# Altium schematic symbol library jlcpcb_2025_04_capacitors_extended_0402.schlib: 3594 symbols (part 15 of 20) (continued)
## GRM155R61C475ME11D
designator C?  Capacitance: 4.7uF  (hidden comment: *)
Capacitor, Ceramic (MLCC), 4.7uF, 16V, X5R, SMD 0402; Manufacturer: Murata Electronics; Manufacturer Part Number: GRM155R61C475ME11D; Package Size: 0402; JLCPCB Basic Part: No; JLCPCB Part Number: C2986286; Supplier 1: LCSC; Category: Capacitors - MLCC; Supplier Part Number 1: C2986286; Voltage Rating: 16V; Temperature Coefficient: X5R; RoHS: Yes; ComponentLink1Description: Datasheet; ComponentLink1URL: https://wmsc.lcsc.com/wmsc/upload/file/pdf/v2/lcsc/2204251600_Murata-Electronics-GRM155R61C475ME11D_C2986286.pdf; ComponentLink2Description: JLCPCB Part URL; ComponentLink2URL: https://jlcpcb.com/partdetail/C2986286; ComponentLink3Description: LCSC Part URL; ComponentLink3URL: https://lcsc.com/product-detail/Multilayer-Ceramic-Capacitors-MLCC---SMD-SMT_Murata-Electronics-Murata-Electronics-GRM155R61C475ME11D_C2986286.html
footprint CAP-0402 (0402 (1005M) Capacitor)
pins: 1, 2

## GRM155R61C475ME15D
designator C?  Capacitance: 4.7uF  (hidden comment: *)
Capacitor, Ceramic (MLCC), 4.7uF, ±20%, ±20%, SMD 0402; Manufacturer: Murata Electronics; Manufacturer Part Number: GRM155R61C475ME15D; Package Size: 0402; JLCPCB Basic Part: No; JLCPCB Part Number: C913526; Supplier 1: LCSC; Category: Capacitors - MLCC; Supplier Part Number 1: C913526; Tolerance: ±20%; RoHS: Yes; ComponentLink1Description: Datasheet; ComponentLink2Description: JLCPCB Part URL; ComponentLink2URL: https://jlcpcb.com/partdetail/C913526; ComponentLink3Description: LCSC Part URL; ComponentLink3URL: https://lcsc.com/product-detail/Multilayer-Ceramic-Capacitors-MLCC---SMD-SMT_Murata-Electronics-Murata-Electronics-GRM155R61C475ME15D_C913526.html
footprint CAP-0402 (0402 (1005M) Capacitor)
pins: 1, 2

## GRM155R61E102KA01D
designator C?  Capacitance: 1nF  (hidden comment: *)
Capacitor, Ceramic (MLCC), 1nF, ±10%, 25V, X5R, ±10%, SMD 0402; Manufacturer: Murata Electronics; Manufacturer Part Number: GRM155R61E102KA01D; Package Size: 0402; JLCPCB Basic Part: No; JLCPCB Part Number: C188805; Supplier 1: LCSC; Category: Capacitors - MLCC; Supplier Part Number 1: C188805; Tolerance: ±10%; Voltage Rating: 25V; Temperature Coefficient: X5R; RoHS: Yes; ComponentLink1Description: Datasheet; ComponentLink1URL: https://wmsc.lcsc.com/wmsc/upload/file/pdf/v2/lcsc/1811081514_Murata-Electronics-GRM155R61E102KA01D_C188805.pdf; ComponentLink2Description: JLCPCB Part URL; ComponentLink2URL: https://jlcpcb.com/partdetail/C188805; ComponentLink3Description: LCSC Part URL; ComponentLink3URL: https://lcsc.com/product-detail/Multilayer-Ceramic-Capacitors-MLCC---SMD-SMT_Murata-Electronics-Murata-Electronics-GRM155R61E102KA01D_C188805.html
footprint CAP-0402 (0402 (1005M) Capacitor)
pins: 1, 2

## GRM155R61E104KA87D
designator C?  Capacitance: 100nF  (hidden comment: *)
Capacitor, Ceramic (MLCC), 100nF, ±10%, 25V, X5R, ±10%, SMD 0402; Manufacturer: Murata Electronics; Manufacturer Part Number: GRM155R61E104KA87D; Package Size: 0402; JLCPCB Basic Part: No; JLCPCB Part Number: C77008; Supplier 1: LCSC; Category: Capacitors - MLCC; Supplier Part Number 1: C77008; Tolerance: ±10%; Voltage Rating: 25V; Temperature Coefficient: X5R; RoHS: Yes; ComponentLink1Description: Datasheet; ComponentLink1URL: https://wmsc.lcsc.com/wmsc/upload/file/pdf/v2/lcsc/1806151821_Murata-Electronics-GRM155R61E104KA87D_C77008.pdf; ComponentLink2Description: JLCPCB Part URL; ComponentLink2URL: https://jlcpcb.com/partdetail/C77008; ComponentLink3Description: LCSC Part URL; ComponentLink3URL: https://lcsc.com/product-detail/Multilayer-Ceramic-Capacitors-MLCC---SMD-SMT_Murata-Electronics-Murata-Electronics-GRM155R61E104KA87D_C77008.html
footprint CAP-0402 (0402 (1005M) Capacitor)
pins: 1, 2

## GRM155R61E105KA12D
designator C?  Capacitance: 1uF  (hidden comment: *)
Capacitor, Ceramic (MLCC), 1uF, ±10%, 25V, X5R, ±10%, SMD 0402; Manufacturer: Murata Electronics; Manufacturer Part Number: GRM155R61E105KA12D; Package Size: 0402; JLCPCB Basic Part: No; JLCPCB Part Number: C77009; Supplier 1: LCSC; Category: Capacitors - MLCC; Supplier Part Number 1: C77009; Tolerance: ±10%; Voltage Rating: 25V; Temperature Coefficient: X5R; RoHS: Yes; ComponentLink1Description: Datasheet; ComponentLink1URL: https://wmsc.lcsc.com/wmsc/upload/file/pdf/v2/lcsc/1811081616_Murata-Electronics-GRM155R61E105KA12D_C77009.pdf; ComponentLink2Description: JLCPCB Part URL; ComponentLink2URL: https://jlcpcb.com/partdetail/C77009; ComponentLink3Description: LCSC Part URL; ComponentLink3URL: https://lcsc.com/product-detail/Multilayer-Ceramic-Capacitors-MLCC---SMD-SMT_Murata-Electronics-Murata-Electronics-GRM155R61E105KA12D_C77009.html
footprint CAP-0402 (0402 (1005M) Capacitor)
pins: 1, 2

## GRM155R61E105KE11D
designator C?  Capacitance: 1uF  (hidden comment: *)
Capacitor, Ceramic (MLCC), 1uF, ±10%, 25V, X5R, ±10%, SMD 0402; Manufacturer: Murata Electronics; Manufacturer Part Number: GRM155R61E105KE11D; Package Size: 0402; JLCPCB Basic Part: No; JLCPCB Part Number: C426636; Supplier 1: LCSC; Category: Capacitors - MLCC; Supplier Part Number 1: C426636; Tolerance: ±10%; Voltage Rating: 25V; Temperature Coefficient: X5R; RoHS: Yes; ComponentLink1Description: Datasheet; ComponentLink1URL: https://wmsc.lcsc.com/wmsc/upload/file/pdf/v2/lcsc/2304140030_Murata-Electronics-GRM155R61E105KE11D_C426636.pdf; ComponentLink2Description: JLCPCB Part URL; ComponentLink2URL: https://jlcpcb.com/partdetail/C426636; ComponentLink3Description: LCSC Part URL; ComponentLink3URL: https://lcsc.com/product-detail/Multilayer-Ceramic-Capacitors-MLCC---SMD-SMT_Murata-Electronics-Murata-Electronics-GRM155R61E105KE11D_C426636.html
footprint CAP-0402 (0402 (1005M) Capacitor)
pins: 1, 2

## GRM155R61E105MA12D
designator C?  Capacitance: 1uF  (hidden comment: *)
Capacitor, Ceramic (MLCC), 1uF, ±20%, 25V, X5R, ±20%, SMD 0402; Manufacturer: Murata Electronics; Manufacturer Part Number: GRM155R61E105MA12D; Package Size: 0402; JLCPCB Basic Part: No; JLCPCB Part Number: C181014; Supplier 1: LCSC; Category: Capacitors - MLCC; Supplier Part Number 1: C181014; Tolerance: ±20%; Voltage Rating: 25V; Temperature Coefficient: X5R; RoHS: Yes; ComponentLink1Description: Datasheet; ComponentLink1URL: https://wmsc.lcsc.com/wmsc/upload/file/pdf/v2/lcsc/2308111636_Murata-Electronics-GRM155R61E105MA12D_C181014.pdf; ComponentLink2Description: JLCPCB Part URL; ComponentLink2URL: https://jlcpcb.com/partdetail/C181014; ComponentLink3Description: LCSC Part URL; ComponentLink3URL: https://lcsc.com/product-detail/Multilayer-Ceramic-Capacitors-MLCC---SMD-SMT_Murata-Electronics-Murata-Electronics-GRM155R61E105MA12D_C181014.html
footprint CAP-0402 (0402 (1005M) Capacitor)
pins: 1, 2

## GRM155R61E222KA01D
designator C?  Capacitance: 2.2nF  (hidden comment: *)
Capacitor, Ceramic (MLCC), 2.2nF, ±10%, 25V, X5R, ±10%, SMD 0402; Manufacturer: Murata Electronics; Manufacturer Part Number: GRM155R61E222KA01D; Package Size: 0402; JLCPCB Basic Part: No; JLCPCB Part Number: C528973; Supplier 1: LCSC; Category: Capacitors - MLCC; Supplier Part Number 1: C528973; Tolerance: ±10%; Voltage Rating: 25V; Temperature Coefficient: X5R; RoHS: Yes; ComponentLink1Description: Datasheet; ComponentLink1URL: https://wmsc.lcsc.com/wmsc/upload/file/pdf/v2/lcsc/2005141808_Murata-Electronics-GRM155R61E222KA01D_C528973.pdf; ComponentLink2Description: JLCPCB Part URL; ComponentLink2URL: https://jlcpcb.com/partdetail/C528973; ComponentLink3Description: LCSC Part URL; ComponentLink3URL: https://lcsc.com/product-detail/Multilayer-Ceramic-Capacitors-MLCC---SMD-SMT_Murata-Electronics-Murata-Electronics-GRM155R61E222KA01D_C528973.html
footprint CAP-0402 (0402 (1005M) Capacitor)
pins: 1, 2

## GRM155R61E224KE01D
designator C?  Capacitance: 220nF  (hidden comment: *)
Capacitor, Ceramic (MLCC), 220nF, ±10%, 25V, X5R, ±10%, SMD 0402; Manufacturer: Murata Electronics; Manufacturer Part Number: GRM155R61E224KE01D; Package Size: 0402; JLCPCB Basic Part: No; JLCPCB Part Number: C162177; Supplier 1: LCSC; Category: Capacitors - MLCC; Supplier Part Number 1: C162177; Tolerance: ±10%; Voltage Rating: 25V; Temperature Coefficient: X5R; RoHS: Yes; ComponentLink1Description: Datasheet; ComponentLink1URL: https://wmsc.lcsc.com/wmsc/upload/file/pdf/v2/lcsc/1912111437_Murata-Electronics-GRM155R61E224KE01D_C162177.pdf; ComponentLink2Description: JLCPCB Part URL; ComponentLink2URL: https://jlcpcb.com/partdetail/C162177; ComponentLink3Description: LCSC Part URL; ComponentLink3URL: https://lcsc.com/product-detail/Multilayer-Ceramic-Capacitors-MLCC---SMD-SMT_Murata-Electronics-Murata-Electronics-GRM155R61E224KE01D_C162177.html
footprint CAP-0402 (0402 (1005M) Capacitor)
pins: 1, 2

## GRM155R61E225KE11D
designator C?  Capacitance: 2.2uF  (hidden comment: *)
Capacitor, Ceramic (MLCC), 2.2uF, ±10%, 25V, X5R, ±10%, SMD 0402; Manufacturer: Murata Electronics; Manufacturer Part Number: GRM155R61E225KE11D; Package Size: 0402; JLCPCB Basic Part: No; JLCPCB Part Number: C385032; Supplier 1: LCSC; Category: Capacitors - MLCC; Supplier Part Number 1: C385032; Tolerance: ±10%; Voltage Rating: 25V; Temperature Coefficient: X5R; RoHS: Yes; ComponentLink1Description: Datasheet; ComponentLink1URL: https://wmsc.lcsc.com/wmsc/upload/file/pdf/v2/lcsc/1912111437_Murata-Electronics-GRM155R61E225KE11D_C385032.pdf; ComponentLink2Description: JLCPCB Part URL; ComponentLink2URL: https://jlcpcb.com/partdetail/C385032; ComponentLink3Description: LCSC Part URL; ComponentLink3URL: https://lcsc.com/product-detail/Multilayer-Ceramic-Capacitors-MLCC---SMD-SMT_Murata-Electronics-Murata-Electronics-GRM155R61E225KE11D_C385032.html
footprint CAP-0402 (0402 (1005M) Capacitor)
pins: 1, 2

## GRM155R61E225ME15D
designator C?  Capacitance: 2.2uF  (hidden comment: *)
Capacitor, Ceramic (MLCC), 2.2uF, ±20%, 25V, X5R, ±20%, SMD 0402; Manufacturer: Murata Electronics; Manufacturer Part Number: GRM155R61E225ME15D; Package Size: 0402; JLCPCB Basic Part: No; JLCPCB Part Number: C72203; Supplier 1: LCSC; Category: Capacitors - MLCC; Supplier Part Number 1: C72203; Tolerance: ±20%; Voltage Rating: 25V; Temperature Coefficient: X5R; RoHS: Yes; ComponentLink1Description: Datasheet; ComponentLink1URL: https://wmsc.lcsc.com/wmsc/upload/file/pdf/v2/lcsc/2001171841_Murata-Electronics-GRM155R61E225ME15D_C72203.pdf; ComponentLink2Description: JLCPCB Part URL; ComponentLink2URL: https://jlcpcb.com/partdetail/C72203; ComponentLink3Description: LCSC Part URL; ComponentLink3URL: https://lcsc.com/product-detail/Multilayer-Ceramic-Capacitors-MLCC---SMD-SMT_Murata-Electronics-Murata-Electronics-GRM155R61E225ME15D_C72203.html
footprint CAP-0402 (0402 (1005M) Capacitor)
pins: 1, 2

## GRM155R61E474KA12D
designator C?  Capacitance: 470nF  (hidden comment: *)
Capacitor, Ceramic (MLCC), 470nF, ±10%, ±10%, SMD 0402; Manufacturer: Murata Electronics; Manufacturer Part Number: GRM155R61E474KA12D; Package Size: 0402; JLCPCB Basic Part: No; JLCPCB Part Number: C426055; Supplier 1: LCSC; Category: Capacitors - MLCC; Supplier Part Number 1: C426055; Tolerance: ±10%; RoHS: Yes; ComponentLink1Description: Datasheet; ComponentLink1URL: https://wmsc.lcsc.com/wmsc/upload/file/pdf/v2/lcsc/2204251630_Murata-Electronics-GRM155R61E474KA12D_C426055.pdf; ComponentLink2Description: JLCPCB Part URL; ComponentLink2URL: https://jlcpcb.com/partdetail/C426055; ComponentLink3Description: LCSC Part URL; ComponentLink3URL: https://lcsc.com/product-detail/Multilayer-Ceramic-Capacitors-MLCC---SMD-SMT_Murata-Electronics-Murata-Electronics-GRM155R61E474KA12D_C426055.html
footprint CAP-0402 (0402 (1005M) Capacitor)
pins: 1, 2

## GRM155R61E474KE01D
designator C?  Capacitance: 470nF  (hidden comment: *)
Capacitor, Ceramic (MLCC), 470nF, ±10%, 25V, X5R, ±10%, SMD 0402; Manufacturer: Murata Electronics; Manufacturer Part Number: GRM155R61E474KE01D; Package Size: 0402; JLCPCB Basic Part: No; JLCPCB Part Number: C437526; Supplier 1: LCSC; Category: Capacitors - MLCC; Supplier Part Number 1: C437526; Tolerance: ±10%; Voltage Rating: 25V; Temperature Coefficient: X5R; RoHS: Yes; ComponentLink1Description: Datasheet; ComponentLink1URL: https://wmsc.lcsc.com/wmsc/upload/file/pdf/v2/lcsc/2202140030_Murata-Electronics-GRM155R61E474KE01D_C437526.pdf; ComponentLink2Description: JLCPCB Part URL; ComponentLink2URL: https://jlcpcb.com/partdetail/C437526; ComponentLink3Description: LCSC Part URL; ComponentLink3URL: https://lcsc.com/product-detail/Multilayer-Ceramic-Capacitors-MLCC---SMD-SMT_Murata-Electronics-Murata-Electronics-GRM155R61E474KE01D_C437526.html
footprint CAP-0402 (0402 (1005M) Capacitor)
pins: 1, 2

## GRM155R61E475ME15D
designator C?  Capacitance: 4.7uF  (hidden comment: *)
Capacitor, Ceramic (MLCC), 4.7uF, 25V, X5R, SMD 0402; Manufacturer: Murata Electronics; Manufacturer Part Number: GRM155R61E475ME15D; Package Size: 0402; JLCPCB Basic Part: No; JLCPCB Part Number: C2858031; Supplier 1: LCSC; Category: Capacitors - MLCC; Supplier Part Number 1: C2858031; Voltage Rating: 25V; Temperature Coefficient: X5R; RoHS: Yes; ComponentLink1Description: Datasheet; ComponentLink1URL: https://wmsc.lcsc.com/wmsc/upload/file/pdf/v2/lcsc/2108150230_Murata-Electronics-GRM155R61E475ME15D_C2858031.pdf; ComponentLink2Description: JLCPCB Part URL; ComponentLink2URL: https://jlcpcb.com/partdetail/C2858031; ComponentLink3Description: LCSC Part URL; ComponentLink3URL: https://lcsc.com/product-detail/Multilayer-Ceramic-Capacitors-MLCC---SMD-SMT_Murata-Electronics-Murata-Electronics-GRM155R61E475ME15D_C2858031.html
footprint CAP-0402 (0402 (1005M) Capacitor)
pins: 1, 2

## GRM155R61H102KA01D
designator C?  Capacitance: 1nF  (hidden comment: *)
Capacitor, Ceramic (MLCC), 1nF, ±10%, null, X5R, ±10%, SMD 0402; Manufacturer: Murata Electronics; Manufacturer Part Number: GRM155R61H102KA01D; Package Size: 0402; JLCPCB Basic Part: No; JLCPCB Part Number: C701318; Supplier 1: LCSC; Category: Capacitors - MLCC; Supplier Part Number 1: C701318; Tolerance: ±10%; Voltage Rating: null; Temperature Coefficient: X5R; RoHS: Yes; ComponentLink1Description: Datasheet; ComponentLink1URL: https://wmsc.lcsc.com/wmsc/upload/file/pdf/v2/lcsc/2304140030_Murata-Electronics-GRM155R61H102KA01D_C701318.pdf; ComponentLink2Description: JLCPCB Part URL; ComponentLink2URL: https://jlcpcb.com/partdetail/C701318; ComponentLink3Description: LCSC Part URL; ComponentLink3URL: https://lcsc.com/product-detail/Multilayer-Ceramic-Capacitors-MLCC---SMD-SMT_Murata-Electronics-Murata-Electronics-GRM155R61H102KA01D_C701318.html
footprint CAP-0402 (0402 (1005M) Capacitor)
pins: 1, 2

## GRM155R61H104JE14D
designator C?  Capacitance: 100nF  (hidden comment: *)
Capacitor, Ceramic (MLCC), 100nF, ±5%, ±5%, SMD 0402; Manufacturer: Murata Electronics; Manufacturer Part Number: GRM155R61H104JE14D; Package Size: 0402; JLCPCB Basic Part: No; JLCPCB Part Number: C426067; Supplier 1: LCSC; Category: Capacitors - MLCC; Supplier Part Number 1: C426067; Tolerance: ±5%; RoHS: Yes; ComponentLink1Description: Datasheet; ComponentLink1URL: https://wmsc.lcsc.com/wmsc/upload/file/pdf/v2/lcsc/2304140030_Murata-Electronics-GRM155R61H104JE14D_C426067.pdf; ComponentLink2Description: JLCPCB Part URL; ComponentLink2URL: https://jlcpcb.com/partdetail/C426067; ComponentLink3Description: LCSC Part URL; ComponentLink3URL: https://lcsc.com/product-detail/Multilayer-Ceramic-Capacitors-MLCC---SMD-SMT_Murata-Electronics-Murata-Electronics-GRM155R61H104JE14D_C426067.html
footprint CAP-0402 (0402 (1005M) Capacitor)
pins: 1, 2

## GRM155R61H104KE14D
designator C?  Capacitance: 100nF  (hidden comment: *)
Capacitor, Ceramic (MLCC), 100nF, ±10%, 50V, X5R, ±10%, SMD 0402; Manufacturer: Murata Electronics; Manufacturer Part Number: GRM155R61H104KE14D; Package Size: 0402; JLCPCB Basic Part: No; JLCPCB Part Number: C85960; Supplier 1: LCSC; Category: Capacitors - MLCC; Supplier Part Number 1: C85960; Tolerance: ±10%; Voltage Rating: 50V; Temperature Coefficient: X5R; RoHS: Yes; ComponentLink1Description: Datasheet; ComponentLink1URL: https://wmsc.lcsc.com/wmsc/upload/file/pdf/v2/lcsc/2304140030_Murata-Electronics-GRM155R61H104KE14D_C85960.pdf; ComponentLink2Description: JLCPCB Part URL; ComponentLink2URL: https://jlcpcb.com/partdetail/C85960; ComponentLink3Description: LCSC Part URL; ComponentLink3URL: https://lcsc.com/product-detail/Multilayer-Ceramic-Capacitors-MLCC---SMD-SMT_Murata-Electronics-Murata-Electronics-GRM155R61H104KE14D_C85960.html
footprint CAP-0402 (0402 (1005M) Capacitor)
pins: 1, 2

## GRM155R61H105KE05D
designator C?  Capacitance: 1uF  (hidden comment: *)
Capacitor, Ceramic (MLCC), 1uF, ±10%, 50V, X5R, ±10%, SMD 0402; Manufacturer: Murata Electronics; Manufacturer Part Number: GRM155R61H105KE05D; Package Size: 0402; JLCPCB Basic Part: No; JLCPCB Part Number: C1518208; Supplier 1: LCSC; Category: Capacitors - MLCC; Supplier Part Number 1: C1518208; Tolerance: ±10%; Voltage Rating: 50V; Temperature Coefficient: X5R; RoHS: Yes; ComponentLink1Description: Datasheet; ComponentLink1URL: https://wmsc.lcsc.com/wmsc/upload/file/pdf/v2/lcsc/2201180430_Murata-Electronics-GRM155R61H105KE05D_C1518208.pdf; ComponentLink2Description: JLCPCB Part URL; ComponentLink2URL: https://jlcpcb.com/partdetail/C1518208; ComponentLink3Description: LCSC Part URL; ComponentLink3URL: https://lcsc.com/product-detail/Multilayer-Ceramic-Capacitors-MLCC---SMD-SMT_Murata-Electronics-Murata-Electronics-GRM155R61H105KE05D_C1518208.html
footprint CAP-0402 (0402 (1005M) Capacitor)
pins: 1, 2

## GRM155R61H105ME05D
designator C?  Capacitance: 1uF  (hidden comment: *)
Capacitor, Ceramic (MLCC), 1uF, ±20%, 50V, X5R, ±20%, SMD 0402; Manufacturer: Murata Electronics; Manufacturer Part Number: GRM155R61H105ME05D; Package Size: 0402; JLCPCB Basic Part: No; JLCPCB Part Number: C5119299; Supplier 1: LCSC; Category: Capacitors - MLCC; Supplier Part Number 1: C5119299; Tolerance: ±20%; Voltage Rating: 50V; Temperature Coefficient: X5R; RoHS: Yes; ComponentLink1Description: Datasheet; ComponentLink1URL: https://wmsc.lcsc.com/wmsc/upload/file/pdf/v2/lcsc/2207251801_Murata-Electronics-GRM155R61H105ME05D_C5119299.pdf; ComponentLink2Description: JLCPCB Part URL; ComponentLink2URL: https://jlcpcb.com/partdetail/C5119299; ComponentLink3Description: LCSC Part URL; ComponentLink3URL: https://lcsc.com/product-detail/Multilayer-Ceramic-Capacitors-MLCC---SMD-SMT_Murata-Electronics-Murata-Electronics-GRM155R61H105ME05D_C5119299.html
footprint CAP-0402 (0402 (1005M) Capacitor)
pins: 1, 2

## GRM155R61H472KA01D
designator C?  Capacitance: 4.7nF  (hidden comment: *)
Capacitor, Ceramic (MLCC), 4.7nF, ±10%, null, X5R, ±10%, SMD 0402; Manufacturer: Murata Electronics; Manufacturer Part Number: GRM155R61H472KA01D; Package Size: 0402; JLCPCB Basic Part: No; JLCPCB Part Number: C237393; Supplier 1: LCSC; Category: Capacitors - MLCC; Supplier Part Number 1: C237393; Tolerance: ±10%; Voltage Rating: null; Temperature Coefficient: X5R; RoHS: Yes; ComponentLink1Description: Datasheet; ComponentLink1URL: https://wmsc.lcsc.com/wmsc/upload/file/pdf/v2/lcsc/2011191435_Murata-Electronics-GRM155R61H472KA01D_C237393.pdf; ComponentLink2Description: JLCPCB Part URL; ComponentLink2URL: https://jlcpcb.com/partdetail/C237393; ComponentLink3Description: LCSC Part URL; ComponentLink3URL: https://lcsc.com/product-detail/Multilayer-Ceramic-Capacitors-MLCC---SMD-SMT_Murata-Electronics-Murata-Electronics-GRM155R61H472KA01D_C237393.html
footprint CAP-0402 (0402 (1005M) Capacitor)
pins: 1, 2

## GRM155R61H473KE19D
designator C?  Capacitance: 47nF  (hidden comment: *)
Capacitor, Ceramic (MLCC), 47nF, ±10%, null, X5R, ±10%, SMD 0402; Manufacturer: Murata Electronics; Manufacturer Part Number: GRM155R61H473KE19D; Package Size: 0402; JLCPCB Basic Part: No; JLCPCB Part Number: C913545; Supplier 1: LCSC; Category: Capacitors - MLCC; Supplier Part Number 1: C913545; Tolerance: ±10%; Voltage Rating: null; Temperature Coefficient: X5R; RoHS: Yes; ComponentLink1Description: Datasheet; ComponentLink1URL: https://wmsc.lcsc.com/wmsc/upload/file/pdf/v2/lcsc/2201131300_Murata-Electronics-GRM155R61H473KE19D_C913545.pdf; ComponentLink2Description: JLCPCB Part URL; ComponentLink2URL: https://jlcpcb.com/partdetail/C913545; ComponentLink3Description: LCSC Part URL; ComponentLink3URL: https://lcsc.com/product-detail/Multilayer-Ceramic-Capacitors-MLCC---SMD-SMT_Murata-Electronics-Murata-Electronics-GRM155R61H473KE19D_C913545.html
footprint CAP-0402 (0402 (1005M) Capacitor)
pins: 1, 2

## GRM155R61H474KE11D
designator C?  Capacitance: 470nF  (hidden comment: *)
Capacitor, Ceramic (MLCC), 470nF, ±10%, 50V, X5R, ±10%, SMD 0402; Manufacturer: Murata Electronics; Manufacturer Part Number: GRM155R61H474KE11D; Package Size: 0402; JLCPCB Basic Part: No; JLCPCB Part Number: C437527; Supplier 1: LCSC; Category: Capacitors - MLCC; Supplier Part Number 1: C437527; Tolerance: ±10%; Voltage Rating: 50V; Temperature Coefficient: X5R; RoHS: Yes; ComponentLink1Description: Datasheet; ComponentLink1URL: https://wmsc.lcsc.com/wmsc/upload/file/pdf/v2/lcsc/2304140030_Murata-Electronics-GRM155R61H474KE11D_C437527.pdf; ComponentLink2Description: JLCPCB Part URL; ComponentLink2URL: https://jlcpcb.com/partdetail/C437527; ComponentLink3Description: LCSC Part URL; ComponentLink3URL: https://lcsc.com/product-detail/Multilayer-Ceramic-Capacitors-MLCC---SMD-SMT_Murata-Electronics-Murata-Electronics-GRM155R61H474KE11D_C437527.html
footprint CAP-0402 (0402 (1005M) Capacitor)
pins: 1, 2

## GRM155R62A104KE14D
designator C?  Capacitance: 100nF  (hidden comment: *)
Capacitor, Ceramic (MLCC), 100nF, ±10%, 100V, X5R, ±10%, SMD 0402; Manufacturer: Murata Electronics; Manufacturer Part Number: GRM155R62A104KE14D; Package Size: 0402; JLCPCB Basic Part: No; JLCPCB Part Number: C162178; Supplier 1: LCSC; Category: Capacitors - MLCC; Supplier Part Number 1: C162178; Tolerance: ±10%; Voltage Rating: 100V; Temperature Coefficient: X5R; RoHS: Yes; ComponentLink1Description: Datasheet; ComponentLink1URL: https://wmsc.lcsc.com/wmsc/upload/file/pdf/v2/lcsc/2010101433_Murata-Electronics-GRM155R62A104KE14D_C162178.pdf; ComponentLink2Description: JLCPCB Part URL; ComponentLink2URL: https://jlcpcb.com/partdetail/C162178; ComponentLink3Description: LCSC Part URL; ComponentLink3URL: https://lcsc.com/product-detail/Multilayer-Ceramic-Capacitors-MLCC---SMD-SMT_Murata-Electronics-Murata-Electronics-GRM155R62A104KE14D_C162178.html
footprint CAP-0402 (0402 (1005M) Capacitor)
pins: 1, 2

## GRM155R62A104ME14D
designator C?  Capacitance: 100nF  (hidden comment: *)
Capacitor, Ceramic (MLCC), 100nF, ±20%, 100V, X5R, ±20%, SMD 0402; Manufacturer: Murata Electronics; Manufacturer Part Number: GRM155R62A104ME14D; Package Size: 0402; JLCPCB Basic Part: No; JLCPCB Part Number: C162179; Supplier 1: LCSC; Category: Capacitors - MLCC; Supplier Part Number 1: C162179; Tolerance: ±20%; Voltage Rating: 100V; Temperature Coefficient: X5R; RoHS: Yes; ComponentLink1Description: Datasheet; ComponentLink1URL: https://wmsc.lcsc.com/wmsc/upload/file/pdf/v2/lcsc/2304140030_Murata-Electronics-GRM155R62A104ME14D_C162179.pdf; ComponentLink2Description: JLCPCB Part URL; ComponentLink2URL: https://jlcpcb.com/partdetail/C162179; ComponentLink3Description: LCSC Part URL; ComponentLink3URL: https://lcsc.com/product-detail/Multilayer-Ceramic-Capacitors-MLCC---SMD-SMT_Murata-Electronics-Murata-Electronics-GRM155R62A104ME14D_C162179.html
footprint CAP-0402 (0402 (1005M) Capacitor)
pins: 1, 2

## GRM155R70J105KA12D
designator C?  Capacitance: 1uF  (hidden comment: *)
Capacitor, Ceramic (MLCC), 1uF, ±10%, 6.3V, X7R, ±10%, SMD 0402; Manufacturer: Murata Electronics; Manufacturer Part Number: GRM155R70J105KA12D; Package Size: 0402; JLCPCB Basic Part: No; JLCPCB Part Number: C88945; Supplier 1: LCSC; Category: Capacitors - MLCC; Supplier Part Number 1: C88945; Tolerance: ±10%; Voltage Rating: 6.3V; Temperature Coefficient: X7R; RoHS: Yes; ComponentLink1Description: Datasheet; ComponentLink1URL: https://wmsc.lcsc.com/wmsc/upload/file/pdf/v2/lcsc/2304140030_Murata-Electronics-GRM155R70J105KA12D_C88945.pdf; ComponentLink2Description: JLCPCB Part URL; ComponentLink2URL: https://jlcpcb.com/partdetail/C88945; ComponentLink3Description: LCSC Part URL; ComponentLink3URL: https://lcsc.com/product-detail/Multilayer-Ceramic-Capacitors-MLCC---SMD-SMT_Murata-Electronics-Murata-Electronics-GRM155R70J105KA12D_C88945.html
footprint CAP-0402 (0402 (1005M) Capacitor)
pins: 1, 2

## GRM155R70J105MA12D
designator C?  Capacitance: 1uF  (hidden comment: *)
Capacitor, Ceramic (MLCC), 1uF, ±20%, 6.3V, X7R, ±20%, SMD 0402; Manufacturer: Murata Electronics; Manufacturer Part Number: GRM155R70J105MA12D; Package Size: 0402; JLCPCB Basic Part: No; JLCPCB Part Number: C913490; Supplier 1: LCSC; Category: Capacitors - MLCC; Supplier Part Number 1: C913490; Tolerance: ±20%; Voltage Rating: 6.3V; Temperature Coefficient: X7R; RoHS: Yes; ComponentLink1Description: Datasheet; ComponentLink1URL: https://wmsc.lcsc.com/wmsc/upload/file/pdf/v2/lcsc/2201131300_Murata-Electronics-GRM155R70J105MA12D_C913490.pdf; ComponentLink2Description: JLCPCB Part URL; ComponentLink2URL: https://jlcpcb.com/partdetail/C913490; ComponentLink3Description: LCSC Part URL; ComponentLink3URL: https://lcsc.com/product-detail/Multilayer-Ceramic-Capacitors-MLCC---SMD-SMT_Murata-Electronics-Murata-Electronics-GRM155R70J105MA12D_C913490.html
footprint CAP-0402 (0402 (1005M) Capacitor)
pins: 1, 2

## GRM155R71A104KA01D
designator C?  Capacitance: 100nF  (hidden comment: *)
Capacitor, Ceramic (MLCC), 100nF, ±10%, 10V, X7R, ±10%, SMD 0402; Manufacturer: Murata Electronics; Manufacturer Part Number: GRM155R71A104KA01D; Package Size: 0402; JLCPCB Basic Part: No; JLCPCB Part Number: C71687; Supplier 1: LCSC; Category: Capacitors - MLCC; Supplier Part Number 1: C71687; Tolerance: ±10%; Voltage Rating: 10V; Temperature Coefficient: X7R; RoHS: Yes; ComponentLink1Description: Datasheet; ComponentLink1URL: https://wmsc.lcsc.com/wmsc/upload/file/pdf/v2/lcsc/1811081610_Murata-Electronics-GRM155R71A104KA01D_C71687.pdf; ComponentLink2Description: JLCPCB Part URL; ComponentLink2URL: https://jlcpcb.com/partdetail/C71687; ComponentLink3Description: LCSC Part URL; ComponentLink3URL: https://lcsc.com/product-detail/Multilayer-Ceramic-Capacitors-MLCC---SMD-SMT_Murata-Electronics-Murata-Electronics-GRM155R71A104KA01D_C71687.html
footprint CAP-0402 (0402 (1005M) Capacitor)
pins: 1, 2

## GRM155R71A224KE01D
designator C?  Capacitance: 220nF  (hidden comment: *)
Capacitor, Ceramic (MLCC), 220nF, ±10%, 10V, X7R, ±10%, SMD 0402; Manufacturer: Murata Electronics; Manufacturer Part Number: GRM155R71A224KE01D; Package Size: 0402; JLCPCB Basic Part: No; JLCPCB Part Number: C180472; Supplier 1: LCSC; Category: Capacitors - MLCC; Supplier Part Number 1: C180472; Tolerance: ±10%; Voltage Rating: 10V; Temperature Coefficient: X7R; RoHS: Yes; ComponentLink1Description: Datasheet; ComponentLink1URL: https://wmsc.lcsc.com/wmsc/upload/file/pdf/v2/lcsc/1811081530_Murata-Electronics-GRM155R71A224KE01D_C180472.pdf; ComponentLink2Description: JLCPCB Part URL; ComponentLink2URL: https://jlcpcb.com/partdetail/C180472; ComponentLink3Description: LCSC Part URL; ComponentLink3URL: https://lcsc.com/product-detail/Multilayer-Ceramic-Capacitors-MLCC---SMD-SMT_Murata-Electronics-Murata-Electronics-GRM155R71A224KE01D_C180472.html
footprint CAP-0402 (0402 (1005M) Capacitor)
pins: 1, 2

## GRM155R71C103JA01D
designator C?  Capacitance: 10nF  (hidden comment: *)
Capacitor, Ceramic (MLCC), 10nF, ±5%, 16V, X7R, ±5%, SMD 0402; Manufacturer: Murata Electronics; Manufacturer Part Number: GRM155R71C103JA01D; Package Size: 0402; JLCPCB Basic Part: No; JLCPCB Part Number: C88947; Supplier 1: LCSC; Category: Capacitors - MLCC; Supplier Part Number 1: C88947; Tolerance: ±5%; Voltage Rating: 16V; Temperature Coefficient: X7R; RoHS: Yes; ComponentLink1Description: Datasheet; ComponentLink1URL: https://wmsc.lcsc.com/wmsc/upload/file/pdf/v2/lcsc/2304140030_Murata-Electronics-GRM155R71C103JA01D_C88947.pdf; ComponentLink2Description: JLCPCB Part URL; ComponentLink2URL: https://jlcpcb.com/partdetail/C88947; ComponentLink3Description: LCSC Part URL; ComponentLink3URL: https://lcsc.com/product-detail/Multilayer-Ceramic-Capacitors-MLCC---SMD-SMT_Murata-Electronics-Murata-Electronics-GRM155R71C103JA01D_C88947.html
footprint CAP-0402 (0402 (1005M) Capacitor)
pins: 1, 2

## GRM155R71C103KA01D
designator C?  Capacitance: 10nF  (hidden comment: *)
Capacitor, Ceramic (MLCC), 10nF, ±10%, 16V, X7R, ±10%, SMD 0402; Manufacturer: Murata Electronics; Manufacturer Part Number: GRM155R71C103KA01D; Package Size: 0402; JLCPCB Basic Part: No; JLCPCB Part Number: C85735; Supplier 1: LCSC; Category: Capacitors - MLCC; Supplier Part Number 1: C85735; Tolerance: ±10%; Voltage Rating: 16V; Temperature Coefficient: X7R; RoHS: Yes; ComponentLink1Description: Datasheet; ComponentLink1URL: https://wmsc.lcsc.com/wmsc/upload/file/pdf/v2/lcsc/1811081612_Murata-Electronics-GRM155R71C103KA01D_C85735.pdf; ComponentLink2Description: JLCPCB Part URL; ComponentLink2URL: https://jlcpcb.com/partdetail/C85735; ComponentLink3Description: LCSC Part URL; ComponentLink3URL: https://lcsc.com/product-detail/Multilayer-Ceramic-Capacitors-MLCC---SMD-SMT_Murata-Electronics-Murata-Electronics-GRM155R71C103KA01D_C85735.html
footprint CAP-0402 (0402 (1005M) Capacitor)
pins: 1, 2

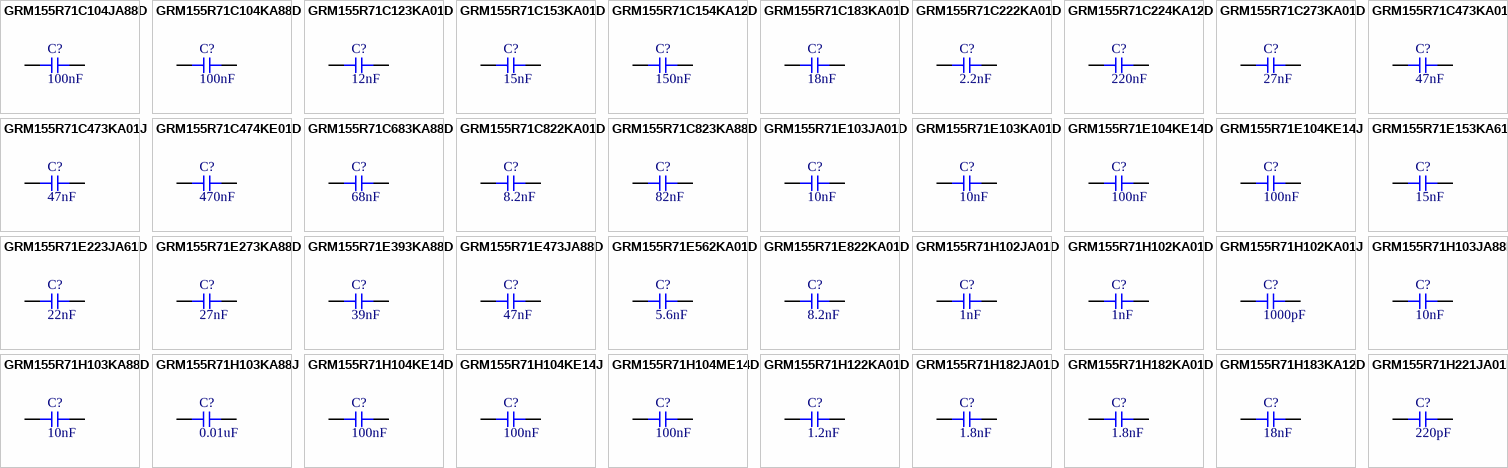
[diagram p69: symbols GRM155R71C104JA88D to GRM155R71H221JA01D]

## GRM155R71C104JA88D
designator C?  Capacitance: 100nF  (hidden comment: *)
Capacitor, Ceramic (MLCC), 100nF, ±5%, 16V, X7R, ±5%, SMD 0402; Manufacturer: Murata Electronics; Manufacturer Part Number: GRM155R71C104JA88D; Package Size: 0402; JLCPCB Basic Part: No; JLCPCB Part Number: C913742; Supplier 1: LCSC; Category: Capacitors - MLCC; Supplier Part Number 1: C913742; Tolerance: ±5%; Voltage Rating: 16V; Temperature Coefficient: X7R; RoHS: Yes; ComponentLink1Description: Datasheet; ComponentLink1URL: https://wmsc.lcsc.com/wmsc/upload/file/pdf/v2/lcsc/2201131300_Murata-Electronics-GRM155R71C104JA88D_C913742.pdf; ComponentLink2Description: JLCPCB Part URL; ComponentLink2URL: https://jlcpcb.com/partdetail/C913742; ComponentLink3Description: LCSC Part URL; ComponentLink3URL: https://lcsc.com/product-detail/Multilayer-Ceramic-Capacitors-MLCC---SMD-SMT_Murata-Electronics-Murata-Electronics-GRM155R71C104JA88D_C913742.html
footprint CAP-0402 (0402 (1005M) Capacitor)
pins: 1, 2

## GRM155R71C104KA88D
designator C?  Capacitance: 100nF  (hidden comment: *)
Capacitor, Ceramic (MLCC), 100nF, ±10%, 16V, X7R, ±10%, SMD 0402; Manufacturer: Murata Electronics; Manufacturer Part Number: GRM155R71C104KA88D; Package Size: 0402; JLCPCB Basic Part: No; JLCPCB Part Number: C71629; Supplier 1: LCSC; Category: Capacitors - MLCC; Supplier Part Number 1: C71629; Tolerance: ±10%; Voltage Rating: 16V; Temperature Coefficient: X7R; RoHS: Yes; ComponentLink1Description: Datasheet; ComponentLink1URL: https://wmsc.lcsc.com/wmsc/upload/file/pdf/v2/lcsc/1811081616_Murata-Electronics-GRM155R71C104KA88D_C71629.pdf; ComponentLink2Description: JLCPCB Part URL; ComponentLink2URL: https://jlcpcb.com/partdetail/C71629; ComponentLink3Description: LCSC Part URL; ComponentLink3URL: https://lcsc.com/product-detail/Multilayer-Ceramic-Capacitors-MLCC---SMD-SMT_Murata-Electronics-Murata-Electronics-GRM155R71C104KA88D_C71629.html
footprint CAP-0402 (0402 (1005M) Capacitor)
pins: 1, 2

## GRM155R71C123KA01D
designator C?  Capacitance: 12nF  (hidden comment: *)
Capacitor, Ceramic (MLCC), 12nF, ±10%, 16V, X7R, ±10%, SMD 0402; Manufacturer: Murata Electronics; Manufacturer Part Number: GRM155R71C123KA01D; Package Size: 0402; JLCPCB Basic Part: No; JLCPCB Part Number: C576460; Supplier 1: LCSC; Category: Capacitors - MLCC; Supplier Part Number 1: C576460; Tolerance: ±10%; Voltage Rating: 16V; Temperature Coefficient: X7R; RoHS: Yes; ComponentLink1Description: Datasheet; ComponentLink1URL: https://wmsc.lcsc.com/wmsc/upload/file/pdf/v2/lcsc/2009181504_Murata-Electronics-GRM155R71C123KA01D_C576460.pdf; ComponentLink2Description: JLCPCB Part URL; ComponentLink2URL: https://jlcpcb.com/partdetail/C576460; ComponentLink3Description: LCSC Part URL; ComponentLink3URL: https://lcsc.com/product-detail/Multilayer-Ceramic-Capacitors-MLCC---SMD-SMT_Murata-Electronics-Murata-Electronics-GRM155R71C123KA01D_C576460.html
footprint CAP-0402 (0402 (1005M) Capacitor)
pins: 1, 2

## GRM155R71C153KA01D
designator C?  Capacitance: 15nF  (hidden comment: *)
Capacitor, Ceramic (MLCC), 15nF, ±10%, 16V, X7R, ±10%, SMD 0402; Manufacturer: Murata Electronics; Manufacturer Part Number: GRM155R71C153KA01D; Package Size: 0402; JLCPCB Basic Part: No; JLCPCB Part Number: C113050; Supplier 1: LCSC; Category: Capacitors - MLCC; Supplier Part Number 1: C113050; Tolerance: ±10%; Voltage Rating: 16V; Temperature Coefficient: X7R; RoHS: Yes; ComponentLink1Description: Datasheet; ComponentLink1URL: https://wmsc.lcsc.com/wmsc/upload/file/pdf/v2/lcsc/2304140030_Murata-Electronics-GRM155R71C153KA01D_C113050.pdf; ComponentLink2Description: JLCPCB Part URL; ComponentLink2URL: https://jlcpcb.com/partdetail/C113050; ComponentLink3Description: LCSC Part URL; ComponentLink3URL: https://lcsc.com/product-detail/Multilayer-Ceramic-Capacitors-MLCC---SMD-SMT_Murata-Electronics-Murata-Electronics-GRM155R71C153KA01D_C113050.html
footprint CAP-0402 (0402 (1005M) Capacitor)
pins: 1, 2

## GRM155R71C154KA12D
designator C?  Capacitance: 150nF  (hidden comment: *)
Capacitor, Ceramic (MLCC), 150nF, ±10%, 16V, X7R, ±10%, SMD 0402; Manufacturer: Murata Electronics; Manufacturer Part Number: GRM155R71C154KA12D; Package Size: 0402; JLCPCB Basic Part: No; JLCPCB Part Number: C162182; Supplier 1: LCSC; Category: Capacitors - MLCC; Supplier Part Number 1: C162182; Tolerance: ±10%; Voltage Rating: 16V; Temperature Coefficient: X7R; RoHS: Yes; ComponentLink1Description: Datasheet; ComponentLink1URL: https://wmsc.lcsc.com/wmsc/upload/file/pdf/v2/lcsc/2304140030_Murata-Electronics-GRM155R71C154KA12D_C162182.pdf; ComponentLink2Description: JLCPCB Part URL; ComponentLink2URL: https://jlcpcb.com/partdetail/C162182; ComponentLink3Description: LCSC Part URL; ComponentLink3URL: https://lcsc.com/product-detail/Multilayer-Ceramic-Capacitors-MLCC---SMD-SMT_Murata-Electronics-Murata-Electronics-GRM155R71C154KA12D_C162182.html
footprint CAP-0402 (0402 (1005M) Capacitor)
pins: 1, 2

## GRM155R71C183KA01D
designator C?  Capacitance: 18nF  (hidden comment: *)
Capacitor, Ceramic (MLCC), 18nF, ±10%, 16V, X7R, ±10%, SMD 0402; Manufacturer: Murata Electronics; Manufacturer Part Number: GRM155R71C183KA01D; Package Size: 0402; JLCPCB Basic Part: No; JLCPCB Part Number: C527997; Supplier 1: LCSC; Category: Capacitors - MLCC; Supplier Part Number 1: C527997; Tolerance: ±10%; Voltage Rating: 16V; Temperature Coefficient: X7R; RoHS: Yes; ComponentLink1Description: Datasheet; ComponentLink1URL: https://wmsc.lcsc.com/wmsc/upload/file/pdf/v2/lcsc/2304140030_Murata-Electronics-GRM155R71C183KA01D_C527997.pdf; ComponentLink2Description: JLCPCB Part URL; ComponentLink2URL: https://jlcpcb.com/partdetail/C527997; ComponentLink3Description: LCSC Part URL; ComponentLink3URL: https://lcsc.com/product-detail/Multilayer-Ceramic-Capacitors-MLCC---SMD-SMT_Murata-Electronics-Murata-Electronics-GRM155R71C183KA01D_C527997.html
footprint CAP-0402 (0402 (1005M) Capacitor)
pins: 1, 2

## GRM155R71C222KA01D
designator C?  Capacitance: 2.2nF  (hidden comment: *)
Capacitor, Ceramic (MLCC), 2.2nF, ±10%, 16V, X7R, ±10%, SMD 0402; Manufacturer: Murata Electronics; Manufacturer Part Number: GRM155R71C222KA01D; Package Size: 0402; JLCPCB Basic Part: No; JLCPCB Part Number: C701316; Supplier 1: LCSC; Category: Capacitors - MLCC; Supplier Part Number 1: C701316; Tolerance: ±10%; Voltage Rating: 16V; Temperature Coefficient: X7R; RoHS: Yes; ComponentLink1Description: Datasheet; ComponentLink1URL: https://wmsc.lcsc.com/wmsc/upload/file/pdf/v2/lcsc/2304140030_Murata-Electronics-GRM155R71C222KA01D_C701316.pdf; ComponentLink2Description: JLCPCB Part URL; ComponentLink2URL: https://jlcpcb.com/partdetail/C701316; ComponentLink3Description: LCSC Part URL; ComponentLink3URL: https://lcsc.com/product-detail/Multilayer-Ceramic-Capacitors-MLCC---SMD-SMT_Murata-Electronics-Murata-Electronics-GRM155R71C222KA01D_C701316.html
footprint CAP-0402 (0402 (1005M) Capacitor)
pins: 1, 2

## GRM155R71C224KA12D
designator C?  Capacitance: 220nF  (hidden comment: *)
Capacitor, Ceramic (MLCC), 220nF, ±10%, 16V, X7R, ±10%, SMD 0402; Manufacturer: Murata Electronics; Manufacturer Part Number: GRM155R71C224KA12D; Package Size: 0402; JLCPCB Basic Part: No; JLCPCB Part Number: C77011; Supplier 1: LCSC; Category: Capacitors - MLCC; Supplier Part Number 1: C77011; Tolerance: ±10%; Voltage Rating: 16V; Temperature Coefficient: X7R; RoHS: Yes; ComponentLink1Description: Datasheet; ComponentLink1URL: https://wmsc.lcsc.com/wmsc/upload/file/pdf/v2/lcsc/1811092313_Murata-Electronics-GRM155R71C224KA12D_C77011.pdf; ComponentLink2Description: JLCPCB Part URL; ComponentLink2URL: https://jlcpcb.com/partdetail/C77011; ComponentLink3Description: LCSC Part URL; ComponentLink3URL: https://lcsc.com/product-detail/Multilayer-Ceramic-Capacitors-MLCC---SMD-SMT_Murata-Electronics-Murata-Electronics-GRM155R71C224KA12D_C77011.html
footprint CAP-0402 (0402 (1005M) Capacitor)
pins: 1, 2

## GRM155R71C273KA01D
designator C?  Capacitance: 27nF  (hidden comment: *)
Capacitor, Ceramic (MLCC), 27nF, ±10%, 16V, X7R, ±10%, SMD 0402; Manufacturer: Murata Electronics; Manufacturer Part Number: GRM155R71C273KA01D; Package Size: 0402; JLCPCB Basic Part: No; JLCPCB Part Number: C162184; Supplier 1: LCSC; Category: Capacitors - MLCC; Supplier Part Number 1: C162184; Tolerance: ±10%; Voltage Rating: 16V; Temperature Coefficient: X7R; RoHS: Yes; ComponentLink1Description: Datasheet; ComponentLink1URL: https://wmsc.lcsc.com/wmsc/upload/file/pdf/v2/lcsc/2304140030_Murata-Electronics-GRM155R71C273KA01D_C162184.pdf; ComponentLink2Description: JLCPCB Part URL; ComponentLink2URL: https://jlcpcb.com/partdetail/C162184; ComponentLink3Description: LCSC Part URL; ComponentLink3URL: https://lcsc.com/product-detail/Multilayer-Ceramic-Capacitors-MLCC---SMD-SMT_Murata-Electronics-Murata-Electronics-GRM155R71C273KA01D_C162184.html
footprint CAP-0402 (0402 (1005M) Capacitor)
pins: 1, 2

## GRM155R71C473KA01D
designator C?  Capacitance: 47nF  (hidden comment: *)
Capacitor, Ceramic (MLCC), 47nF, ±10%, 16V, X7R, ±10%, SMD 0402; Manufacturer: Murata Electronics; Manufacturer Part Number: GRM155R71C473KA01D; Package Size: 0402; JLCPCB Basic Part: No; JLCPCB Part Number: C77012; Supplier 1: LCSC; Category: Capacitors - MLCC; Supplier Part Number 1: C77012; Tolerance: ±10%; Voltage Rating: 16V; Temperature Coefficient: X7R; RoHS: Yes; ComponentLink1Description: Datasheet; ComponentLink1URL: https://wmsc.lcsc.com/wmsc/upload/file/pdf/v2/lcsc/1811081616_Murata-Electronics-GRM155R71C473KA01D_C77012.pdf; ComponentLink2Description: JLCPCB Part URL; ComponentLink2URL: https://jlcpcb.com/partdetail/C77012; ComponentLink3Description: LCSC Part URL; ComponentLink3URL: https://lcsc.com/product-detail/Multilayer-Ceramic-Capacitors-MLCC---SMD-SMT_Murata-Electronics-Murata-Electronics-GRM155R71C473KA01D_C77012.html
footprint CAP-0402 (0402 (1005M) Capacitor)
pins: 1, 2

## GRM155R71C473KA01J
designator C?  Capacitance: 47nF  (hidden comment: *)
Capacitor, Ceramic (MLCC), 47nF, ±10%, 16V, X7R, ±10%, SMD 0402; Manufacturer: Murata Electronics; Manufacturer Part Number: GRM155R71C473KA01J; Package Size: 0402; JLCPCB Basic Part: No; JLCPCB Part Number: C2168391; Supplier 1: LCSC; Category: Capacitors - MLCC; Supplier Part Number 1: C2168391; Tolerance: ±10%; Voltage Rating: 16V; Temperature Coefficient: X7R; RoHS: Yes; ComponentLink1Description: Datasheet; ComponentLink1URL: https://wmsc.lcsc.com/wmsc/upload/file/pdf/v2/lcsc/2308111638_Murata-Electronics-GRM155R71C473KA01J_C2168391.pdf; ComponentLink2Description: JLCPCB Part URL; ComponentLink2URL: https://jlcpcb.com/partdetail/C2168391; ComponentLink3Description: LCSC Part URL; ComponentLink3URL: https://lcsc.com/product-detail/Multilayer-Ceramic-Capacitors-MLCC---SMD-SMT_Murata-Electronics-Murata-Electronics-GRM155R71C473KA01J_C2168391.html
footprint CAP-0402 (0402 (1005M) Capacitor)
pins: 1, 2

## GRM155R71C474KE01D
designator C?  Capacitance: 470nF  (hidden comment: *)
Capacitor, Ceramic (MLCC), 470nF, ±10%, 16V, X7R, ±10%, SMD 0402; Manufacturer: Murata Electronics; Manufacturer Part Number: GRM155R71C474KE01D; Package Size: 0402; JLCPCB Basic Part: No; JLCPCB Part Number: C471404; Supplier 1: LCSC; Category: Capacitors - MLCC; Supplier Part Number 1: C471404; Tolerance: ±10%; Voltage Rating: 16V; Temperature Coefficient: X7R; RoHS: Yes; ComponentLink1Description: Datasheet; ComponentLink1URL: https://wmsc.lcsc.com/wmsc/upload/file/pdf/v2/lcsc/2407101354_Murata-Electronics-GRM155R71C474KE01D_C471404.pdf; ComponentLink2Description: JLCPCB Part URL; ComponentLink2URL: https://jlcpcb.com/partdetail/C471404; ComponentLink3Description: LCSC Part URL; ComponentLink3URL: https://lcsc.com/product-detail/Multilayer-Ceramic-Capacitors-MLCC---SMD-SMT_Murata-Electronics-Murata-Electronics-GRM155R71C474KE01D_C471404.html
footprint CAP-0402 (0402 (1005M) Capacitor)
pins: 1, 2

## GRM155R71C683KA88D
designator C?  Capacitance: 68nF  (hidden comment: *)
Capacitor, Ceramic (MLCC), 68nF, ±10%, 16V, X7R, ±10%, SMD 0402; Manufacturer: Murata Electronics; Manufacturer Part Number: GRM155R71C683KA88D; Package Size: 0402; JLCPCB Basic Part: No; JLCPCB Part Number: C97868; Supplier 1: LCSC; Category: Capacitors - MLCC; Supplier Part Number 1: C97868; Tolerance: ±10%; Voltage Rating: 16V; Temperature Coefficient: X7R; RoHS: Yes; ComponentLink1Description: Datasheet; ComponentLink1URL: https://wmsc.lcsc.com/wmsc/upload/file/pdf/v2/lcsc/1811081531_Murata-Electronics-GRM155R71C683KA88D_C97868.pdf; ComponentLink2Description: JLCPCB Part URL; ComponentLink2URL: https://jlcpcb.com/partdetail/C97868; ComponentLink3Description: LCSC Part URL; ComponentLink3URL: https://lcsc.com/product-detail/Multilayer-Ceramic-Capacitors-MLCC---SMD-SMT_Murata-Electronics-Murata-Electronics-GRM155R71C683KA88D_C97868.html
footprint CAP-0402 (0402 (1005M) Capacitor)
pins: 1, 2

## GRM155R71C822KA01D
designator C?  Capacitance: 8.2nF  (hidden comment: *)
Capacitor, Ceramic (MLCC), 8.2nF, ±10%, 16V, X7R, ±10%, SMD 0402; Manufacturer: Murata Electronics; Manufacturer Part Number: GRM155R71C822KA01D; Package Size: 0402; JLCPCB Basic Part: No; JLCPCB Part Number: C701315; Supplier 1: LCSC; Category: Capacitors - MLCC; Supplier Part Number 1: C701315; Tolerance: ±10%; Voltage Rating: 16V; Temperature Coefficient: X7R; RoHS: Yes; ComponentLink1Description: Datasheet; ComponentLink1URL: https://wmsc.lcsc.com/wmsc/upload/file/pdf/v2/lcsc/2304140030_Murata-Electronics-GRM155R71C822KA01D_C701315.pdf; ComponentLink2Description: JLCPCB Part URL; ComponentLink2URL: https://jlcpcb.com/partdetail/C701315; ComponentLink3Description: LCSC Part URL; ComponentLink3URL: https://lcsc.com/product-detail/Multilayer-Ceramic-Capacitors-MLCC---SMD-SMT_Murata-Electronics-Murata-Electronics-GRM155R71C822KA01D_C701315.html
footprint CAP-0402 (0402 (1005M) Capacitor)
pins: 1, 2

## GRM155R71C823KA88D
designator C?  Capacitance: 82nF  (hidden comment: *)
Capacitor, Ceramic (MLCC), 82nF, ±10%, 16V, X7R, ±10%, SMD 0402; Manufacturer: Murata Electronics; Manufacturer Part Number: GRM155R71C823KA88D; Package Size: 0402; JLCPCB Basic Part: No; JLCPCB Part Number: C524617; Supplier 1: LCSC; Category: Capacitors - MLCC; Supplier Part Number 1: C524617; Tolerance: ±10%; Voltage Rating: 16V; Temperature Coefficient: X7R; RoHS: Yes; ComponentLink1Description: Datasheet; ComponentLink1URL: https://wmsc.lcsc.com/wmsc/upload/file/pdf/v2/lcsc/2008191834_Murata-Electronics-GRM155R71C823KA88D_C524617.pdf; ComponentLink2Description: JLCPCB Part URL; ComponentLink2URL: https://jlcpcb.com/partdetail/C524617; ComponentLink3Description: LCSC Part URL; ComponentLink3URL: https://lcsc.com/product-detail/Multilayer-Ceramic-Capacitors-MLCC---SMD-SMT_Murata-Electronics-Murata-Electronics-GRM155R71C823KA88D_C524617.html
footprint CAP-0402 (0402 (1005M) Capacitor)
pins: 1, 2

## GRM155R71E103JA01D
designator C?  Capacitance: 10nF  (hidden comment: *)
Capacitor, Ceramic (MLCC), 10nF, ±5%, 25V, X7R, ±5%, SMD 0402; Manufacturer: Murata Electronics; Manufacturer Part Number: GRM155R71E103JA01D; Package Size: 0402; JLCPCB Basic Part: No; JLCPCB Part Number: C576461; Supplier 1: LCSC; Category: Capacitors - MLCC; Supplier Part Number 1: C576461; Tolerance: ±5%; Voltage Rating: 25V; Temperature Coefficient: X7R; RoHS: Yes; ComponentLink1Description: Datasheet; ComponentLink1URL: https://wmsc.lcsc.com/wmsc/upload/file/pdf/v2/lcsc/2105241310_Murata-Electronics-GRM155R71E103JA01D_C576461.pdf; ComponentLink2Description: JLCPCB Part URL; ComponentLink2URL: https://jlcpcb.com/partdetail/C576461; ComponentLink3Description: LCSC Part URL; ComponentLink3URL: https://lcsc.com/product-detail/Multilayer-Ceramic-Capacitors-MLCC---SMD-SMT_Murata-Electronics-Murata-Electronics-GRM155R71E103JA01D_C576461.html
footprint CAP-0402 (0402 (1005M) Capacitor)
pins: 1, 2

## GRM155R71E103KA01D
designator C?  Capacitance: 10nF  (hidden comment: *)
Capacitor, Ceramic (MLCC), 10nF, ±10%, 25V, X7R, ±10%, SMD 0402; Manufacturer: Murata Electronics; Manufacturer Part Number: GRM155R71E103KA01D; Package Size: 0402; JLCPCB Basic Part: No; JLCPCB Part Number: C77013; Supplier 1: LCSC; Category: Capacitors - MLCC; Supplier Part Number 1: C77013; Tolerance: ±10%; Voltage Rating: 25V; Temperature Coefficient: X7R; RoHS: Yes; ComponentLink1Description: Datasheet; ComponentLink1URL: https://wmsc.lcsc.com/wmsc/upload/file/pdf/v2/lcsc/1811132114_Murata-Electronics-GRM155R71E103KA01D_C77013.pdf; ComponentLink2Description: JLCPCB Part URL; ComponentLink2URL: https://jlcpcb.com/partdetail/C77013; ComponentLink3Description: LCSC Part URL; ComponentLink3URL: https://lcsc.com/product-detail/Multilayer-Ceramic-Capacitors-MLCC---SMD-SMT_Murata-Electronics-Murata-Electronics-GRM155R71E103KA01D_C77013.html
footprint CAP-0402 (0402 (1005M) Capacitor)
pins: 1, 2

## GRM155R71E104KE14D
designator C?  Capacitance: 100nF  (hidden comment: *)
Capacitor, Ceramic (MLCC), 100nF, ±10%, 25V, X7R, ±10%, SMD 0402; Manufacturer: Murata Electronics; Manufacturer Part Number: GRM155R71E104KE14D; Package Size: 0402; JLCPCB Basic Part: No; JLCPCB Part Number: C77014; Supplier 1: LCSC; Category: Capacitors - MLCC; Supplier Part Number 1: C77014; Tolerance: ±10%; Voltage Rating: 25V; Temperature Coefficient: X7R; RoHS: Yes; ComponentLink1Description: Datasheet; ComponentLink1URL: https://wmsc.lcsc.com/wmsc/upload/file/pdf/v2/lcsc/1811081616_Murata-Electronics-GRM155R71E104KE14D_C77014.pdf; ComponentLink2Description: JLCPCB Part URL; ComponentLink2URL: https://jlcpcb.com/partdetail/C77014; ComponentLink3Description: LCSC Part URL; ComponentLink3URL: https://lcsc.com/product-detail/Multilayer-Ceramic-Capacitors-MLCC---SMD-SMT_Murata-Electronics-Murata-Electronics-GRM155R71E104KE14D_C77014.html
footprint CAP-0402 (0402 (1005M) Capacitor)
pins: 1, 2

## GRM155R71E104KE14J
designator C?  Capacitance: 100nF  (hidden comment: *)
Capacitor, Ceramic (MLCC), 100nF, ±10%, 25V, X7R, ±10%, SMD 0402; Manufacturer: Murata Electronics; Manufacturer Part Number: GRM155R71E104KE14J; Package Size: 0402; JLCPCB Basic Part: No; JLCPCB Part Number: C2168305; Supplier 1: LCSC; Category: Capacitors - MLCC; Supplier Part Number 1: C2168305; Tolerance: ±10%; Voltage Rating: 25V; Temperature Coefficient: X7R; RoHS: Yes; ComponentLink1Description: Datasheet; ComponentLink1URL: https://wmsc.lcsc.com/wmsc/upload/file/pdf/v2/lcsc/2202040300_Murata-Electronics-GRM155R71E104KE14J_C2168305.pdf; ComponentLink2Description: JLCPCB Part URL; ComponentLink2URL: https://jlcpcb.com/partdetail/C2168305; ComponentLink3Description: LCSC Part URL; ComponentLink3URL: https://lcsc.com/product-detail/Multilayer-Ceramic-Capacitors-MLCC---SMD-SMT_Murata-Electronics-Murata-Electronics-GRM155R71E104KE14J_C2168305.html
footprint CAP-0402 (0402 (1005M) Capacitor)
pins: 1, 2